# Altium footprint library LEMO THD_OLD.PcbLib: 54 footprints (part 1 of 4) (continued)
## LEMO_EDA-02782-V1-0_misc1 [mm] "Size 0B, 4 Female Contacts Elbow Receptacle (90°) With Two Nut For Panel Mounting"
height 26.9
pads (4):
  round 1.6 hole 0.9: 1(-1.27,-1.27) 2(1.27,-1.27) 3(1.27,1.27) 4(-1.27,1.27)
Top Overlay:
  lines w0.2: -1.52,2.444 -1.52,8.75 cw(c-0.77,8.75) -0.77,9.5 3.57,9.5 ; -1.52,2.586 ccw(c0,0) 1.52,2.586 ; -1.52,7.5 cw(c-0.77,7.5) -0.77,8.25 3.57,8.25 ; -1.02,2.444 -1.02,7.5 cw(c-0.77,7.5) -0.77,7.75 3.57,7.75 ; -1.02,2.821 cw(c0,0) 1.02,2.821 ; -1.02,8.207 -1.02,8.75 cw(c-0.77,8.75) -0.77,9 3.57,9 ; 1.019,7.5 cw(c1.769,7.5) 1.062,7.75 ; 1.02,2.444 1.02,7.5 ; 1.019,6.25 cw(c1.769,6.25) 1.769,7 3.57,7 ; 1.519,6.957 1.519,7.5 ; 1.52,2.444 1.52,6.25 cw(c1.77,6.25) 1.77,6.5 3.57,6.5 ; 1.52,6.957 1.52,7.5 cw(c1.77,7.5) 1.77,7.75 ; 6.77,5.64 3.57,5.64 3.57,10.36 6.77,10.36 ; 18.77,3.502 10.62,3.502 10.62,12.498 ; 18.77,12.498 10.62,12.498 ; 7.07,4.05 6.77,4.35 6.77,11.65 7.07,11.95 ; 7.07,4.05 10.07,4.05 10.07,11.95 ; 7.07,4.05 7.07,11.95 ; 7.07,11.95 10.07,11.95 ; 10.07,11.95 10.62,12.498 ; 18.77,2 20.12,2 21.27,2.664 21.27,13.336 20.12,14 18.77,14 18.77,2
  text "2" at 2.602,-3.567 h1
  text "3" at 2.435,2.764 h1
  text "4" at -3.086,2.778 h1
  text "1" at -3,-3.567 h1
Mechanical 2:
  circle w0.1: c0,0 r3
  lines w0.1: -1.52,7.5 cw(c-0.77,7.5) -0.77,8.25 3.57,8.25 ; -1.02,8.207 -1.02,8.75 cw(c-0.77,8.75) -0.77,9 3.57,9 ; 1.019,7.5 cw(c1.769,7.5) 1.062,7.75 ; 1.019,6.25 cw(c1.769,6.25) 1.769,7 3.57,7 ; 1.02,7.5 1.02,-1.27 ccw(c1.27,-1.27) 1.52,-1.27 1.52,6.25 cw(c1.77,6.25) 1.77,6.5 3.57,6.5 ; 1.519,6.957 1.519,7.5 ; 1.52,6.957 1.52,7.5 cw(c1.77,7.5) 1.77,7.75 ; 3.57,7.75 -0.77,7.75 ccw(c-0.77,7.5) -1.02,7.5 -1.02,-1.27 cw(c-1.27,-1.27) -1.52,-1.27 -1.52,8.75 cw(c-0.77,8.75) -0.77,9.5 3.57,9.5 ; 6.77,5.64 3.57,5.64 3.57,10.36 6.77,10.36 ; 18.77,3.502 10.62,3.502 ; 18.77,12.498 10.62,12.498 10.62,3.502 ; 7.07,4.05 6.77,4.35 6.77,11.65 7.07,11.95 ; 7.07,4.05 10.07,4.05 ; 7.07,4.05 7.07,11.95 ; 7.07,11.95 10.07,11.95 10.07,4.05 ; 10.07,4.05 10.62,3.502 ; 18.77,2 20.12,2 21.27,2.664 21.27,13.336 20.12,14 18.77,14 18.77,2
Mechanical 8:
  lines w0.1: -1.77,-1.27 -1.27,-1.27 ; -1.77,1.27 -1.27,1.27 ; -1.27,-1.77 -1.27,-1.27 ; -1.27,-0.77 -1.27,-1.27 ; -1.27,0.77 -1.27,1.27 ; -1.27,1.77 -1.27,1.27 ; -0.77,-1.27 -1.27,-1.27 ; -0.77,1.27 -1.27,1.27 ; -0.354,-0.354 0,0 ; -0.354,0.354 0,0 ; 0.354,-0.354 0,0 ; 0.354,0.354 0,0 ; 0.77,-1.27 1.27,-1.27 ; 0.77,1.27 1.27,1.27 ; 1.27,-1.77 1.27,-1.27 ; 1.27,-0.77 1.27,-1.27 ; 1.27,0.77 1.27,1.27 ; 1.27,1.77 1.27,1.27 ; 1.77,-1.27 1.27,-1.27 ; 1.77,1.27 1.27,1.27
Mechanical 14:
  text "2" at 2.602,-3.567 h1
  text "3" at 2.435,2.764 h1
  text "4" at -3.086,2.778 h1
  text "1" at -3,-3.567 h1
3D body "LEMO_EDA-02782-V1-0_misc1_Part1.stp": height 23.69, standoff -5.75, extent -3,-3 21.27,12.493
3D body "LEMO_EDA-02782-V1-0_misc1_Part2.stp": height 25.15, standoff 13.25, extent 18.77,2.052 21.27,13.948
3D body "LEMO_EDA-02782-V1-0_misc1_Part3.stp": height 25.45, standoff 12.95, extent 13.265,1.75 16.27,14.25

## LEMO_EDA-02832-V1-0 [mm] "LEMO ECG.0B.302.CLL Adapter Kit For PCB Mount, Size 0B, 2 Female Contacts Straight Receptacle With Two Nut For Panel Mounting"
height 18.5
pads (2):
  round 1.9 hole 1.2: 1(0,1.1) 2(0,-1.1)
Top Overlay:
  circle w0.2: c0,0 r4.6
  circle w0.2: c0,0 r6.25
  lines w0.2: -5.283,-0.75 ccw(c0,0) -0.75,-5.283 ; -5.283,0.75 cw(c0,0) -0.75,5.283 ; -0.765,3.723 cw(c-0.005,0) 0.755,3.723 ; -0.765,3.825 cw(c-0.005,0) 0.755,3.825 ; -0.765,3.927 cw(c-0.005,0) 0.755,3.927 ; -0.765,4.029 cw(c-0.005,0) 0.755,4.029 ; -0.2,3.3 0,3.5 0,2.5 ; 0.75,-5.283 ccw(c0,0) 5.283,-0.75 ; 0.75,5.219 cw(c0,0) 5.219,0.75 ; 0.755,3.724 cw(c0,0) -0.765,3.722 -0.765,4.131 cw(c-0.005,0) 0.755,4.131 0.755,3.723 ; -5.953,-0.75 ccw(c0,0) -0.75,-5.953 -0.75,-5.196 ccw(c0,0) 0.75,-5.196 0.75,-5.953 ccw(c0,0) 5.953,-0.75 5.196,-0.75 ccw(c0,0) 5.196,0.75 5.953,0.75 ccw(c0,0) 0.75,5.953 0.75,5.196 ccw(c0,0) -0.75,5.196 -0.75,5.953 ccw(c0,0) -5.953,0.75 -5.196,0.75 ccw(c0,0) -5.196,-0.75 -5.953,-0.75 ; -4.1,-1.855 ccw(c0,0) 4.1,-1.855 4.1,1.855 ccw(c0,0) -4.1,1.855 -4.1,-1.855
Mechanical 8:
  lines w0.1: -0.5,-1.1 0,-1.1 ; -0.5,0 0,0 ; -0.5,1.1 0,1.1 ; 0,-1.6 0,-1.1 ; 0,-0.6 0,-1.1 ; 0,-0.5 0,0 ; 0,0.5 0,0 ; 0,0.6 0,1.1 ; 0,1.6 0,1.1 ; 0.5,-1.1 0,-1.1 ; 0.5,0 0,0 ; 0.5,1.1 0,1.1
Mechanical 14:
  circle w0.1: c0,1.1 r0.75
  circle w0.1: c0,-1.1 r0.75
  circle w0.1: c0,-1.1 r0.55
  circle w0.1: c0,1.1 r0.55
  circle w0.1: c0,0 r2.25
  circle w0.1: c0,0 r4.6
  circle w0.1: c0,0 r6.25
  lines w0.1: -5.283,-0.75 ccw(c0,0) -0.75,-5.283 ; -5.283,0.75 cw(c0,0) -0.75,5.283 ; -0.765,3.723 cw(c-0.005,0) 0.755,3.723 ; -0.765,3.825 cw(c-0.005,0) 0.755,3.825 ; -0.765,3.927 cw(c-0.005,0) 0.755,3.927 ; -0.765,4.029 cw(c-0.005,0) 0.755,4.029 ; 0.75,-5.283 ccw(c0,0) 5.283,-0.75 ; 0.75,5.219 cw(c0,0) 5.219,0.75 ; 0.755,3.724 cw(c0,0) -0.765,3.722 -0.765,4.131 cw(c-0.005,0) 0.755,4.131 0.755,3.723 ; -5.953,-0.75 ccw(c0,0) -0.75,-5.953 -0.75,-5.196 ccw(c0,0) 0.75,-5.196 0.75,-5.953 ccw(c0,0) 5.953,-0.75 5.196,-0.75 ccw(c0,0) 5.196,0.75 5.953,0.75 ccw(c0,0) 0.75,5.953 0.75,5.196 ccw(c0,0) -0.75,5.196 -0.75,5.953 ccw(c0,0) -5.953,0.75 -5.196,0.75 ccw(c0,0) -5.196,-0.75 -5.953,-0.75 ; -4.1,-1.855 ccw(c0,0) 4.1,-1.855 4.1,1.855 ccw(c0,0) -4.1,1.855 -4.1,-1.855
  lines w0.2: -0.2,3.3 0,3.5 0,2.5
3D body "LEMO_EDA-02832-V1-0_Part1.stp": height 18.5, standoff -9, extent -4.1,-4.482 4.1,4.483
3D body "LEMO_EDA-02832-V1-0_Part4.stp": height 13.3, standoff 12.3, extent -6.25,-6.25 6.25,6.25
3D body "LEMO_EDA-02832-V1-0_Part3.stp": height 12.29, standoff 10.29, extent -5.5,-6.199 5.5,6.199
3D body "LEMO_EDA-02832-V1-0_Part2.stp": height 18.1, standoff 15.6, extent -5.953,-5.953 5.953,5.953

## LEMO_EDA-02833-V1-0 [mm] "LEMO ECG.1B.302.CLL Adapter Kit For PCB Mount, Size 1B, 2 Female Contacts Straight Receptacle With Two Nut For Panel Mounting"
height 23
pads (2):
  round 1.9 hole 1.2: 1(0,1.4) 2(0,-1.4)
Top Overlay:
  circle w0.2: c0,0 r6.845
  circle w0.2: c0,0 r6
  circle w0.2: c0.025,0.025 r4.725
  circle w0.2: c0,0 r2.75
  lines w0.2: -5.25,-2.905 -5.25,2.905 ; -5.25,-1.639 ccw(c0,0) 5.25,-1.639 ; -5.25,1.639 cw(c0,0) 5.25,1.639 ; -1,4.644 -1,5.154 cw(c0,0) 1,5.154 1,4.644 ; -1,4.746 cw(c0,0) 1,4.746 ; -1,4.848 cw(c0,0) 1,4.848 ; -1,4.95 cw(c0,0) 1,4.95 ; -1,5.052 cw(c0,0) 1,5.052 ; -0.2,4 0,4.2 0,3.2 ; 5.25,-2.905 5.25,2.905 ; -7.979,-0.584 ccw(c0,0) -1.414,-7.874 -1.361,-6.866 ccw(c0,0) 0.636,-6.971 0.584,-7.979 ccw(c0,0) 7.874,-1.414 6.866,-1.361 ccw(c0,0) 6.971,0.636 7.979,0.584 ccw(c0,0) 1.414,7.874 1.361,6.866 ccw(c0,0) -0.636,6.971 -0.584,7.979 ccw(c0,0) -7.874,1.414 -6.866,1.361 ccw(c0,0) -6.971,-0.636 -7.979,-0.584
Mechanical 8:
  lines w0.1: -0.5,-1.4 0,-1.4 ; -0.5,0 0,0 ; -0.5,1.4 0,1.4 ; 0,-1.9 0,-1.4 ; 0,-0.9 0,-1.4 ; 0,-0.5 0,0 ; 0,0.5 0,0 ; 0,0.9 0,1.4 ; 0,1.9 0,1.4 ; 0.5,-1.4 0,-1.4 ; 0.5,0 0,0 ; 0.5,1.4 0,1.4
Mechanical 14:
  circle w0.1: c0,0 r6.845
  circle w0.1: c0,0 r6
  circle w0.1: c0.025,0.025 r4.725
  circle w0.1: c0,0 r2.75
  circle w0.1: c0,1.4 r0.5
  circle w0.1: c0,1.4 r0.8
  circle w0.1: c0,-1.4 r0.5
  circle w0.1: c0,-1.4 r0.8
  lines w0.1: -5.25,-2.905 -5.25,2.905 ; -5.25,-1.639 ccw(c0,0) 5.25,-1.639 ; -5.25,1.639 cw(c0,0) 5.25,1.639 ; -1,4.644 -1,5.154 cw(c0,0) 1,5.154 1,4.644 ; -1,4.746 cw(c0,0) 1,4.746 ; -1,4.848 cw(c0,0) 1,4.848 ; -1,4.95 cw(c0,0) 1,4.95 ; -1,5.052 cw(c0,0) 1,5.052 ; 5.25,-2.905 5.25,2.905 ; -7.979,-0.584 ccw(c0,0) -1.414,-7.874 -1.361,-6.866 ccw(c0,0) 0.636,-6.971 0.584,-7.979 ccw(c0,0) 7.874,-1.414 6.866,-1.361 ccw(c0,0) 6.971,0.636 7.979,0.584 ccw(c0,0) 1.414,7.874 1.361,6.866 ccw(c0,0) -0.636,6.971 -0.584,7.979 ccw(c0,0) -7.874,1.414 -6.866,1.361 ccw(c0,0) -6.971,-0.636 -7.979,-0.584
  lines w0.2: -0.2,4 0,4.2 0,3.2
3D body "LEMO_EDA-02833-V1-0_Part4.stp": height 15.3, standoff 14.3, extent -7.895,-7.895 7.895,7.895
3D body "LEMO_EDA-02833-V1-0_Part3.stp": height 14.3, standoff 11.8, extent -7.874,-7.396 7.874,7.396
3D body "LEMO_EDA-02833-V1-0_Part2.stp": height 21.3, standoff 17.8, extent -7.979,-7.979 7.979,7.979
3D body "LEMO_EDA-02833-V1-0_Part1.stp": height 21.8, standoff -9.5, extent -5.25,-5.98 5.25,5.98

## LEMO_EDA-02834-V1-0 [mm] "LEMO ECG.1B.304.CLL Adapter Kit For PCB Mount, Size 1B, 4 Female Contacts Straight Receptacle With Two Nut For Panel Mounting"
height 23
pads (4):
  round 1.9 hole 1.2: 1(-1.1,1.1) 2(-1.1,-1.1) 3(1.1,-1.1) 4(1.1,1.1)
Top Overlay:
  circle w0.2: c0.025,0.025 r4.725
  circle w0.2: c0,0 r6
  circle w0.2: c0,0 r6.845
  lines w0.2: -5.25,-2.905 -5.25,2.905 ; -5.25,-1.639 ccw(c0,0) 5.25,-1.639 ; -5.25,1.639 cw(c0,0) 5.25,1.639 ; -2.186,1.905 ccw(c0,0) 1.787,2.284 ; -1.965,0.063 cw(c-1.1,1.1) -0.146,2.055 ; -1.5,3.7 -1.3,3.9 -1.3,2.9 ; -1,4.644 -1,5.154 cw(c0,0) 1,5.154 1,4.644 ; -1,4.746 cw(c0,0) 1,4.746 ; -1,4.848 cw(c0,0) 1,4.848 ; -1,4.95 cw(c0,0) 1,4.95 ; -1,5.052 cw(c0,0) 1,5.052 ; 5.25,-2.905 5.25,2.905 ; -7.979,-0.584 ccw(c0,0) -1.413,-7.874 -1.361,-6.866 ccw(c0,0) 0.637,-6.971 0.584,-7.979 ccw(c0,0) 7.874,-1.414 6.867,-1.361 ccw(c0,0) 6.971,0.636 7.979,0.584 ccw(c0,0) 1.414,7.874 1.361,6.866 ccw(c0,0) -0.636,6.971 -0.584,7.979 ccw(c0,0) -7.874,1.414 -6.866,1.361 ccw(c0,0) -6.971,-0.636 -7.979,-0.584
Mechanical 8:
  lines w0.1: -1.6,-1.1 -1.1,-1.1 ; -1.6,1.1 -1.1,1.1 ; -1.1,-1.6 -1.1,-1.1 ; -1.1,-0.6 -1.1,-1.1 ; -1.1,0.6 -1.1,1.1 ; -1.1,1.6 -1.1,1.1 ; -0.6,-1.1 -1.1,-1.1 ; -0.6,1.1 -1.1,1.1 ; -0.5,0 0,0 ; 0,-0.5 0,0 ; 0,0.5 0,0 ; 0.5,0 0,0 ; 0.6,-1.1 1.1,-1.1 ; 0.6,1.1 1.1,1.1 ; 1.1,-1.6 1.1,-1.1 ; 1.1,-0.6 1.1,-1.1 ; 1.1,0.6 1.1,1.1 ; 1.1,1.6 1.1,1.1 ; 1.6,-1.1 1.1,-1.1 ; 1.6,1.1 1.1,1.1
Mechanical 14:
  circle w0.1: c1.104,-1.104 r0.4
  circle w0.1: c1.104,-1.104 r0.6
  circle w0.1: c1.104,1.096 r0.4
  circle w0.1: c1.104,1.096 r0.6
  circle w0.1: c-1.096,-1.104 r0.4
  circle w0.1: c-1.096,-1.104 r0.6
  circle w0.1: c-1.096,1.096 r0.4
  circle w0.1: c-1.096,1.096 r0.6
  circle w0.1: c0.025,0.025 r4.725
  circle w0.1: c0,0 r6
  circle w0.1: c0,0 r6.845
  lines w0.1: -5.25,-2.905 -5.25,2.905 ; -5.25,-1.639 ccw(c0,0) 5.25,-1.639 ; -5.25,1.639 cw(c0,0) 5.25,1.639 ; -2.186,1.905 ccw(c0,0) 1.787,2.284 ; -1.965,0.063 cw(c-1.1,1.1) -0.146,2.055 ; -1,4.644 -1,5.154 cw(c0,0) 1,5.154 1,4.644 ; -1,4.746 cw(c0,0) 1,4.746 ; -1,4.848 cw(c0,0) 1,4.848 ; -1,4.95 cw(c0,0) 1,4.95 ; -1,5.052 cw(c0,0) 1,5.052 ; 5.25,-2.905 5.25,2.905 ; -7.979,-0.584 ccw(c0,0) -1.413,-7.874 -1.361,-6.866 ccw(c0,0) 0.637,-6.971 0.584,-7.979 ccw(c0,0) 7.874,-1.414 6.867,-1.361 ccw(c0,0) 6.971,0.636 7.979,0.584 ccw(c0,0) 1.414,7.874 1.361,6.866 ccw(c0,0) -0.636,6.971 -0.584,7.979 ccw(c0,0) -7.874,1.414 -6.866,1.361 ccw(c0,0) -6.971,-0.636 -7.979,-0.584
  lines w0.2: -1.5,3.7 -1.3,3.9 -1.3,2.9
3D body "LEMO_EDA-02834-V1-0_Part4.stp": height 15.2, standoff 14.2, extent -7.895,-7.895 7.895,7.895
3D body "LEMO_EDA-02834-V1-0_Part3.stp": height 14.2, standoff 11.7, extent -7.874,-7.395 7.874,7.396
3D body "LEMO_EDA-02834-V1-0_Part2.stp": height 21.2, standoff 17.7, extent -7.979,-7.979 7.979,7.979
3D body "LEMO_EDA-02834-V1-0_Part1.stp": height 21.7, standoff -11.1, extent -5.25,-5.98 5.25,5.98

## LEMO_EDA-02835-V1-0 [mm] "LEMO ECG.0S.302.CLL Adapter Kit For PCB Mount, Size 0S, 1 Female + 1 Male Contacts Receptacle With Two Nuts For Panel Mounting And Hermaphroditic keying (\"half moon\" insert)"
height 17.5
pads (2):
  round 1.9 hole 1.2: 1(0,1.1) 2(0,-1.1)
Top Overlay:
  circle w0.2: c0,0 r4.1
  circle w0.2: c0,0 r3.5
  lines w0.2: -5.283,-0.75 ccw(c0,0) -0.75,-5.283 ; -5.283,0.75 cw(c0,0) -0.75,5.283 ; 0.75,-5.283 ccw(c0,0) 5.283,-0.75 ; 0.75,5.283 cw(c0,0) 5.283,0.75 ; 1.327,1.939 ccw(c0,0) -2.35,0 2.35,0 ccw(c0,0) 2.313,0.413 ; 1.7,1.5 1.9,1.7 1.9,0.7 ; -5.953,-0.75 ccw(c0,0) -0.75,-5.953 -0.75,-5.196 ccw(c0,0) 0.75,-5.196 0.75,-5.953 ccw(c0,0) 5.953,-0.75 5.196,-0.75 ccw(c0,0) 5.196,0.75 5.953,0.75 ccw(c0,0) 0.75,5.953 0.75,5.196 ccw(c0,0) -0.75,5.196 -0.75,5.953 ccw(c0,0) -5.953,0.75 -5.196,0.75 ccw(c0,0) -5.196,-0.75 -5.953,-0.75 ; -4.1,-1.855 ccw(c0,0) 4.1,-1.855 4.1,1.855 ccw(c0,0) -4.1,1.855 -4.1,-1.855
Mechanical 8:
  lines w0.1: -0.5,-1.1 0,-1.1 ; -0.5,1.1 0,1.1 ; 0,-1.6 0,-1.1 ; 0,-0.6 0,-1.1 ; 0,0.6 0,1.1 ; 0,1.6 0,1.1 ; 0.5,-1.1 0,-1.1 ; 0.5,1.1 0,1.1 ; 0,0 0.5,0 0,0 ; 0,0 -0.5,0 0,0 ; 0,0 0,-0.5 0,0 ; 0,0 0,0.5 0,0
Mechanical 14:
  circle w0.1: c0,0 r4.1
  circle w0.1: c0,0 r3.5
  circle w0.1: c0,-1.1 r0.35
  circle w0.1: c0,1.1 r0.35
  lines w0.1: -5.283,-0.75 ccw(c0,0) -0.75,-5.283 ; -5.283,0.75 cw(c0,0) -0.75,5.283 ; -0.35,-1.1 0.35,-1.1 ; -0.335,-1.2 0.335,-1.2 ; -0.335,-1 0.335,-1 ; -0.287,-1.3 0.287,-1.3 ; -0.287,-0.9 0.287,-0.9 ; -0.18,-1.4 0.18,-1.4 ; -0.18,-0.8 0.18,-0.8 ; 0.75,-5.283 ccw(c0,0) 5.283,-0.75 ; 0.75,5.283 cw(c0,0) 5.283,0.75 ; 1.327,1.939 ccw(c0,0) -2.35,0 2.35,0 ccw(c0,0) 2.313,0.413 ; -5.953,-0.75 ccw(c0,0) -0.75,-5.953 -0.75,-5.196 ccw(c0,0) 0.75,-5.196 0.75,-5.953 ccw(c0,0) 5.953,-0.75 5.196,-0.75 ccw(c0,0) 5.196,0.75 5.953,0.75 ccw(c0,0) 0.75,5.953 0.75,5.196 ccw(c0,0) -0.75,5.196 -0.75,5.953 ccw(c0,0) -5.953,0.75 -5.196,0.75 ccw(c0,0) -5.196,-0.75 -5.953,-0.75 ; -4.1,-1.855 ccw(c0,0) 4.1,-1.855 4.1,1.855 ccw(c0,0) -4.1,1.855 -4.1,-1.855
  lines w0.2: 1.7,1.5 1.9,1.7 1.9,0.7
3D body "LEMO_EDA-02835-V1-0_Part1.stp": height 17.5, standoff -9.5, extent -4.1,-4.5 4.1,4.5
3D body "LEMO_EDA-02835-V1-0_Part2.stp": height 17.1, standoff 14.6, extent -5.953,-5.953 5.953,5.953
3D body "LEMO_EDA-02835-V1-0_Part3.stp": height 11.08, standoff 9.08, extent -5.5,-6.199 5.5,6.199
3D body "LEMO_EDA-02835-V1-0_Part4.stp": height 12.1, standoff 11.1, extent -6.25,-6.25 6.25,6.25

## LEMO_EDA-02836-V1-0 [mm] "LEMO ECP.1S.302.CLL Adapter Kit For PCB Mount, Size 1S, 1 Female + 1 Male Contacts Receptacle With Two Nuts For Panel Mounting And Hermaphroditic keying (\"half moon\" insert)"
height 20.7
pads (2):
  round 1.9 hole 1.2: 1(0,1.5) 2(0,-1.5)
Top Overlay:
  circle w0.2: c0,0 r8
  circle w0.2: c0,0 r6
  circle w0.2: c0,0 r4.5
  lines w0.2: -7.937,-1 -6.95,-1 -6.95,1 -7.937,1 ; -7.093,-1 ccw(c0,0) -1,-7.093 ; -7.093,1 cw(c0,0) -1,7.093 ; -5.25,-2.905 -5.25,2.905 ; -5.25,-0.726 ccw(c0,0) 5.25,-0.726 ; -5.25,0.726 cw(c0,0) 5.25,0.726 ; -1.402,2.366 ccw(c0,0) -2.75,0 2.75,0 ccw(c0,0) 2.721,0.4 ; -1,-7.937 -1,-6.95 1,-6.95 1,-7.937 ; -1,7.937 -1,6.95 1,6.95 1,7.937 ; 1,-7.093 ccw(c0,0) 7.093,-1 ; 1,7.093 cw(c0,0) 7.093,1 ; 5.25,-2.905 5.25,2.905 ; 7.937,-1 6.95,-1 6.95,1 7.937,1
  text "1" at 1.6,0.9 h1.2
  text "2" at 1.459,-2.1 h1.2
Mechanical 8:
  lines w0.1: -0.5,-1.5 0,-1.5 ; -0.5,0 0,0 ; -0.5,1.5 0,1.5 ; 0,-2 0,-1.5 ; 0,-1 0,-1.5 ; 0,-0.5 0,0 ; 0,0.5 0,0 ; 0,1 0,1.5 ; 0,2 0,1.5 ; 0.5,-1.5 0,-1.5 ; 0.5,0 0,0 ; 0.5,1.5 0,1.5
Mechanical 14:
  circle w0.1: c0,0 r8
  circle w0.1: c0,0 r6
  circle w0.1: c0,1.5 r0.75
  circle w0.1: c0,1.5 r1
  circle w0.1: c0,-1.5 r0.5
  circle w0.1: c0,0 r4.5
  lines w0.1: -7.937,-1 -6.95,-1 -6.95,1 -7.937,1 ; -7.093,-1 ccw(c0,0) -1,-7.093 ; -7.093,1 cw(c0,0) -1,7.093 ; -5.25,-2.905 -5.25,2.905 ; -5.25,-0.726 ccw(c0,0) 5.25,-0.726 ; -5.25,0.726 cw(c0,0) 5.25,0.726 ; -1,-7.937 -1,-6.95 1,-6.95 1,-7.937 ; -1,7.937 -1,6.95 1,6.95 1,7.937 ; -0.5,-1.5 0.5,-1.5 ; -0.49,-1.6 0.49,-1.6 ; -0.49,-1.4 0.49,-1.4 ; -0.458,-1.7 0.458,-1.7 ; -0.458,-1.3 0.458,-1.3 ; -0.4,-1.8 0.4,-1.8 ; -0.4,-1.2 0.4,-1.2 ; -0.3,-1.9 0.3,-1.9 ; -0.3,-1.1 0.3,-1.1 ; 1,-7.093 ccw(c0,0) 7.093,-1 ; 1,7.093 cw(c0,0) 7.093,1 ; 1.508,2.3 ccw(c0,0) -2.75,0 2.75,0 ccw(c0,0) 2.5,1.146 ; 5.25,-2.905 5.25,2.905 ; 7.937,-1 6.95,-1 6.95,1 7.937,1
  text "2" at 1.459,-2.1 h1.2
  text "1" at 1.6,0.9 h1.2
  text "1" at 1.6,0.9 h1.2
  text "2" at 1.459,-2.1 h1.2
3D body "LEMO_EDA-02836-V1-0_Part4.stp": height 13.5, standoff 12.5, extent -8,-8 8,8
3D body "LEMO_EDA-02836-V1-0_Part3.stp": height 12.5, standoff 10, extent -7,-7.899 7,7.899
3D body "LEMO_EDA-02836-V1-0_Part2.stp": height 19.5, standoff 16, extent -7.937,-7.937 7.937,7.937
3D body "LEMO_EDA-02836-V1-0_Part1.stp": height 20.7, standoff -7.9, extent -5.25,-6 5.25,6

## LEMO_EDA-02837-V1-0 [mm] "LEMO ECP.1S.303.CLL Adapter Kit For PCB Mount, Size 1S, 2 Female + 1 Male Contacts Receptacle With Two Nuts For Panel Mounting And Hermaphroditic keying (\"half moon\" insert)"
height 20
pads (3):
  round 1.9 hole 1.2: 1(1.237,1.237) 2(-1.237,1.237) 3(0,-1.75)
Top Overlay:
  circle w0.2: c0,0 r8
  circle w0.2: c0,0 r6
  lines w0.2: -7.937,-1 -6.95,-1 -6.95,1 -7.937,1 ; -7.093,-1 ccw(c0,0) -1,-7.093 ; -7.093,1 cw(c0,0) -1,7.093 ; -5.25,-2.905 -5.25,2.905 ; -5.25,-0.726 ccw(c0,0) 5.25,-0.726 ; -5.25,0.726 cw(c0,0) 5.25,0.726 ; -4.324,1.244 ccw(c0,0) 4.308,1.3 ; -2.706,0.492 ccw(c0,0) -2.75,0 -2,0 ; -2.7,3.6 cw(c0,0) 2.744,3.567 ; -1,-7.937 -1,-6.95 1,-6.95 1,-7.937 ; -1,7.937 -1,6.95 1,6.95 1,7.937 ; -0.62,2.679 cw(c0,0) 0.716,2.655 ; -0.5,0 0.5,0 ; 1,-7.093 ccw(c0,0) 7.093,-1 ; 1,7.093 cw(c0,0) 7.093,1 ; 2,0 2.75,0 ccw(c0,0) 2.661,0.694 ; 5.25,-2.905 5.25,2.905 ; 7.937,-1 6.95,-1 6.95,1 7.937,1
  text "3" at -2.6,-2.35 h1.2
  text "1" at 3.014,1.6 h1.2
  text "2" at -3.754,1.6 h1.2
Mechanical 8:
  lines w0.1: -1.591,0.884 -1.237,1.237 ; -1.591,1.591 -1.237,1.237 ; -0.884,0.884 -1.237,1.237 ; -0.884,1.591 -1.237,1.237 ; -0.5,0 0,0 ; 0,-0.5 0,0 ; 0,0.5 0,0 ; 0.5,0 0,0 ; 0.884,0.884 1.237,1.237 ; 0.884,1.591 1.237,1.237 ; 1.591,0.884 1.237,1.237 ; 1.591,1.591 1.237,1.237 ; 0,-1.75 -0.5,-1.75 0,-1.75 ; 0,-1.75 0,-1.25 0,-1.75 ; 0,-1.75 0.5,-1.75 0,-1.75 ; 0,-1.75 0,-2.25 0,-1.75
Mechanical 14:
  circle w0.1: c0,0 r8
  circle w0.1: c0,0 r6
  circle w0.1: c0,-1.75 r0.5
  circle w0.1: c0,0 r4.5
  circle w0.1: c-1.237,1.237 r0.4
  circle w0.1: c-1.237,1.237 r0.6
  circle w0.1: c1.237,1.237 r0.4
  circle w0.1: c1.237,1.237 r0.6
  lines w0.1: -7.937,-1 -6.95,-1 -6.95,1 -7.937,1 ; -7.093,-1 ccw(c0,0) -1,-7.093 ; -7.093,1 cw(c0,0) -1,7.093 ; -5.25,-2.905 -5.25,2.905 ; -5.25,-0.726 ccw(c0,0) 5.25,-0.726 ; -5.25,0.726 cw(c0,0) 5.25,0.726 ; -1,-7.937 -1,-6.95 1,-6.95 1,-7.937 ; -1,7.937 -1,6.95 1,6.95 1,7.937 ; -0.5,-1.75 0.5,-1.75 ; -0.49,-1.85 0.49,-1.85 ; -0.49,-1.65 0.49,-1.65 ; -0.458,-1.95 0.458,-1.95 ; -0.458,-1.55 0.458,-1.55 ; -0.4,-2.05 0.4,-2.05 ; -0.4,-1.45 0.4,-1.45 ; -0.3,-2.15 0.3,-2.15 ; -0.3,-1.35 0.3,-1.35 ; 1,-7.093 ccw(c0,0) 7.093,-1 ; 1,7.093 cw(c0,0) 7.093,1 ; 5.25,-2.905 5.25,2.905 ; 7.937,-1 6.95,-1 6.95,1 7.937,1 ; -2.75,0 cw(c0,0) 2.75,0 ; -2.75,0 2.75,0 ; -2.75,0 2.75,0
  text "3" at -2.6,-2.35 h1.2
  text "1" at 2.75,1.6 h1.2
  text "2" at -3.4,1.6 h1.2
3D body "LEMO_EDA-02837-V1-0_Part4.stp": height 12.8, standoff 11.8, extent -8,-8 8,8
3D body "LEMO_EDA-02837-V1-0_Part3.stp": height 11.8, standoff 9.3, extent -7,-7.899 7,7.899
3D body "LEMO_EDA-02837-V1-0_Part2.stp": height 18.8, standoff 15.3, extent -7.937,-7.937 7.937,7.937
3D body "LEMO_EDA-02837-V1-0_Part1.stp": height 20, standoff -10.3, extent -5.25,-6 5.25,6

## LEMO_EDA-02838-V1-0 [mm] "LEMO ECP.1S.304.CLL Adapter Kit For PCB Mount, Size 1S, 2 Female + 2 Male Contacts Receptacle With Two Nuts For Panel Mounting And Hermaphroditic keying (\"half moon\" insert)"
height 20
pads (4):
  round 1.9 hole 1.2: 1(1.237,1.237) 2(-1.237,1.237) 3(-1.237,-1.237) 4(1.237,-1.237)
Top Overlay:
  circle w0.2: c0,0 r6
  circle w0.2: c0,0 r8
  lines w0.2: -7.937,-1 -6.95,-1 -6.95,1 -7.937,1 ; -7.093,-1 ccw(c0,0) -1,-7.093 ; -7.093,1 cw(c0,0) -1,7.093 ; -5.25,-2.905 -5.25,2.905 ; -5.25,-0.726 ccw(c0,0) 5.25,-0.726 ; -5.25,0.726 cw(c0,0) 5.25,0.726 ; -4.396,-0.961 cw(c0,0) -4.324,1.244 ; -2.959,-3.39 ccw(c0,0) 3.189,-3.174 ; -2.706,0.492 ccw(c0,0) -2.75,0 -2,0 ; -2.7,3.6 cw(c0,0) 2.744,3.567 ; -1,-7.937 -1,-6.95 1,-6.95 1,-7.937 ; -1,7.937 -1,6.95 1,6.95 1,7.937 ; -0.62,2.679 cw(c0,0) 0.716,2.655 ; -0.5,0 0.5,0 ; 1,-7.093 ccw(c0,0) 7.093,-1 ; 1,7.093 cw(c0,0) 7.093,1 ; 2,0 2.75,0 ccw(c0,0) 2.661,0.694 ; 4.308,1.3 cw(c0,0) 4.405,-0.92 ; 5.25,-2.905 5.25,2.905 ; 7.937,-1 6.95,-1 6.95,1 7.937,1
  text "4" at 2.914,-2.4 h1.2
  text "3" at -3.754,-2.475 h1.2
  text "2" at -3.754,1.6 h1.2
  text "1" at 3.014,1.6 h1.2
Mechanical 8:
  lines w0.1: -1.591,0.884 -1.237,1.237 ; -1.591,1.591 -1.237,1.237 ; -0.884,0.884 -1.237,1.237 ; -0.884,1.591 -1.237,1.237 ; -0.5,0 0,0 ; 0,-0.5 0,0 ; 0,0.5 0,0 ; 0.5,0 0,0 ; 0.884,0.884 1.237,1.237 ; 0.884,1.591 1.237,1.237 ; 1.591,0.884 1.237,1.237 ; 1.591,1.591 1.237,1.237 ; -1.237,-1.237 -0.884,-1.591 -1.237,-1.237 ; -1.237,-1.237 -1.591,-1.591 -1.237,-1.237 ; -1.237,-1.237 -0.884,-0.884 -1.237,-1.237 ; -1.237,-1.237 -1.591,-0.884 -1.237,-1.237 ; 1.237,-1.237 1.591,-0.884 1.237,-1.237 ; 1.237,-1.237 1.591,-1.591 1.237,-1.237 ; 1.237,-1.237 0.884,-0.884 1.237,-1.237 ; 1.237,-1.237 0.884,-1.591 1.237,-1.237
Mechanical 14:
  circle w0.1: c-1.237,-1.237 r0.5
  circle w0.1: c1.237,-1.237 r0.5
  circle w0.1: c1.237,1.237 r0.6
  circle w0.1: c1.237,1.237 r0.4
  circle w0.1: c-1.237,1.237 r0.6
  circle w0.1: c-1.237,1.237 r0.4
  circle w0.1: c0,0 r6
  circle w0.1: c0,0 r8
  circle w0.1: c0,0 r4.5
  lines w0.1: -7.937,-1 -6.95,-1 -6.95,1 -7.937,1 ; -7.093,-1 ccw(c0,0) -1,-7.093 ; -7.093,1 cw(c0,0) -1,7.093 ; -5.25,-2.905 -5.25,2.905 ; -5.25,-0.726 ccw(c0,0) 5.25,-0.726 ; -5.25,0.726 cw(c0,0) 5.25,0.726 ; -1.732,-1.308 -1.308,-1.732 ; -1.732,-1.167 -1.167,-1.732 ; -1.703,-1.055 -1.055,-1.703 ; -1.655,-0.962 -0.962,-1.655 ; -1.591,-0.884 -0.884,-1.591 ; -1.513,-0.82 -0.82,-1.513 ; -1.42,-0.772 -0.772,-1.42 ; -1.308,-0.742 -0.742,-1.308 ; -1.167,-0.742 -0.742,-1.167 ; -1,-7.937 -1,-6.95 1,-6.95 1,-7.937 ; -1,7.937 -1,6.95 1,6.95 1,7.937 ; 0.742,-1.308 1.308,-0.742 ; 0.742,-1.167 1.167,-0.742 ; 0.772,-1.42 1.42,-0.772 ; 0.82,-1.513 1.513,-0.82 ; 0.884,-1.591 1.591,-0.884 ; 0.962,-1.655 1.655,-0.962 ; 1,-7.093 ccw(c0,0) 7.093,-1 ; 1,7.093 cw(c0,0) 7.093,1 ; 1.055,-1.703 1.703,-1.055 ; 1.167,-1.732 1.732,-1.167 ; 1.308,-1.732 1.732,-1.308 ; 5.25,-2.905 5.25,2.905 ; 7.937,-1 6.95,-1 6.95,1 7.937,1 ; -2.75,0 cw(c0,0) 2.75,0 ; -2.75,0 2.75,0 ; -2.75,0 2.75,0
  text "4" at 2.6,-2.4 h1.2
  text "3" at -3.5,-2.5 h1.2
  text "2" at -3.3,1.7 h1.2
  text "1" at 2.6,1.8 h1.2
3D body "LEMO_EDA-02838-V1-0_Part4.stp": height 12.8, standoff 11.8, extent -8,-8 8,8
3D body "LEMO_EDA-02838-V1-0_Part3.stp": height 11.8, standoff 9.3, extent -7,-7.899 7,7.899
3D body "LEMO_EDA-02838-V1-0_Part2.stp": height 18.8, standoff 15.3, extent -7.937,-7.937 7.937,7.937
3D body "LEMO_EDA-02838-V1-0_Part1.stp": height 20, standoff -10.3, extent -5.25,-6 5.25,6

## LEMO_EPA.00.250.NTN [mm] "50 Ohm size 00 Coaxial Straight socket"
height 14
pads (5):
  round 1.6 hole 0.9: 1(0,0) 2(-2.54,-2.54) 2(-2.54,2.54) 2(2.54,-2.54) 2(2.54,2.54)
Top Overlay:
  lines w0.2: -3.81,-3.4 -3.4,-3.81 3.4,-3.81 3.81,-3.4 3.81,3.4 3.4,3.81 -3.4,3.81 -3.81,3.4 -3.81,-3.4
Mechanical 14:
  circle w0.1: c0,0 r3.4
  lines w0.1: -3.81,-3.39 -3.81,3.39 -3.39,3.81 3.4,3.81 3.81,3.4 3.81,-3.39 3.39,-3.81 -3.39,-3.81 -3.81,-3.39
3D body "LEMO_EPA.00.250.NTN.stp": height 14, standoff -3, extent -3.5,-3.5 3.5,3.5

## LEMO_EPG.00.302.NLN [mm] "Multipole 2 Contacts, 50 Ohm size 00 Coaxial Elbow (90°) Socket With Key"
height 7
pads (6):
  rrect50% 1.1x1.1 hole 0.6 copper offset -0.05,0: 1(-0.635,0)
  rrect50% 1.1x1.1 hole 0.6 copper offset 0.05,0: 2(0.635,0)
  round 1.6 hole 0.9: 3(-2.54,-2.54) 3(-2.54,2.54) 3(2.54,-2.54) 3(2.54,2.54)
Top Overlay:
  circle w0.2: c13,0 r0.5
  lines w0.2: -3.5,-3.1 -3.5,-3.5 -3.1,-3.5 ; -3.5,-2 -3.5,2 ; -3.5,3.1 -3.5,3.5 -3.1,3.5 ; -2,-3.5 2,-3.5 ; -2,3.5 2,3.5 ; 3.1,-3.5 3.5,-3.5 3.5,-3.1 ; 3.1,3.5 3.5,3.5 3.5,3.1 ; 3.5,-3.4 13.8,-3.4 ; 3.5,-2 3.5,2 ; 3.5,3.399 13.8,3.4 ; 13.8,-3.4 14,-3.2 14,3.2 13.8,3.4 ; 13.8,-3.4 13.8,3.4
  text "1" at -2.119,-0.48 h0.97
  text "2" at 1.613,-0.473 h0.97
Mechanical 8:
  lines w0.1: -3.04,-2.54 -2.54,-2.54 ; -3.04,2.54 -2.54,2.54 ; -2.54,-3.04 -2.54,-2.54 ; -2.54,-2.04 -2.54,-2.54 ; -2.54,2.04 -2.54,2.54 ; -2.54,3.04 -2.54,2.54 ; -2.04,-2.54 -2.54,-2.54 ; -2.04,2.54 -2.54,2.54 ; -1.1,0 -0.6,0 ; -0.6,-0.5 -0.6,0 ; -0.6,0.5 -0.6,0 ; -0.5,0 0,0 ; -0.1,0 -0.6,0 ; 0,-0.5 0,0 ; 0,0.5 0,0 ; 0.1,0 0.6,0 ; 0.5,0 0,0 ; 0.6,-0.5 0.6,0 ; 0.6,0.5 0.6,0 ; 1.1,0 0.6,0 ; 2.04,-2.54 2.54,-2.54 ; 2.04,2.54 2.54,2.54 ; 2.54,-3.04 2.54,-2.54 ; 2.54,-2.04 2.54,-2.54 ; 2.54,2.04 2.54,2.54 ; 2.54,3.04 2.54,2.54 ; 3.04,-2.54 2.54,-2.54 ; 3.04,2.54 2.54,2.54
Mechanical 14:
  circle w0.1: c0,0 r3.5
  circle w0.1: c13,0 r0.5
  lines w0.1: 3.5,-3.4 13.8,-3.4 ; 3.5,3.399 13.8,3.4 ; 13.8,-3.4 14,-3.2 14,3.2 13.8,3.4 ; 13.8,-3.4 13.8,3.4 ; -3.5,-3.5 3.5,-3.5 3.5,3.5 -3.5,3.5 -3.5,-3.5
  text "1" at -2.119,-0.48 h0.97
  text "2" at 1.613,-0.473 h0.97
3D body "LEMO_EPG.00.302.NLN.stp": height 7, standoff -3, extent -3.5,-3.5 14,3.5